# Altium footprint library Tomra_Cadstar_Footprints.PcbLib: 373 footprints (part 20 of 24)
Each footprint in its own frame and in the unit in brackets; x right, y up, seen from the top. Pads: shape width x height; smd on the part's side, far side on the other; paste and mask are expansions set on the pad; w line width, h text height; cw(c..) or ccw(c..) is an arc to the next point about the centre after c.
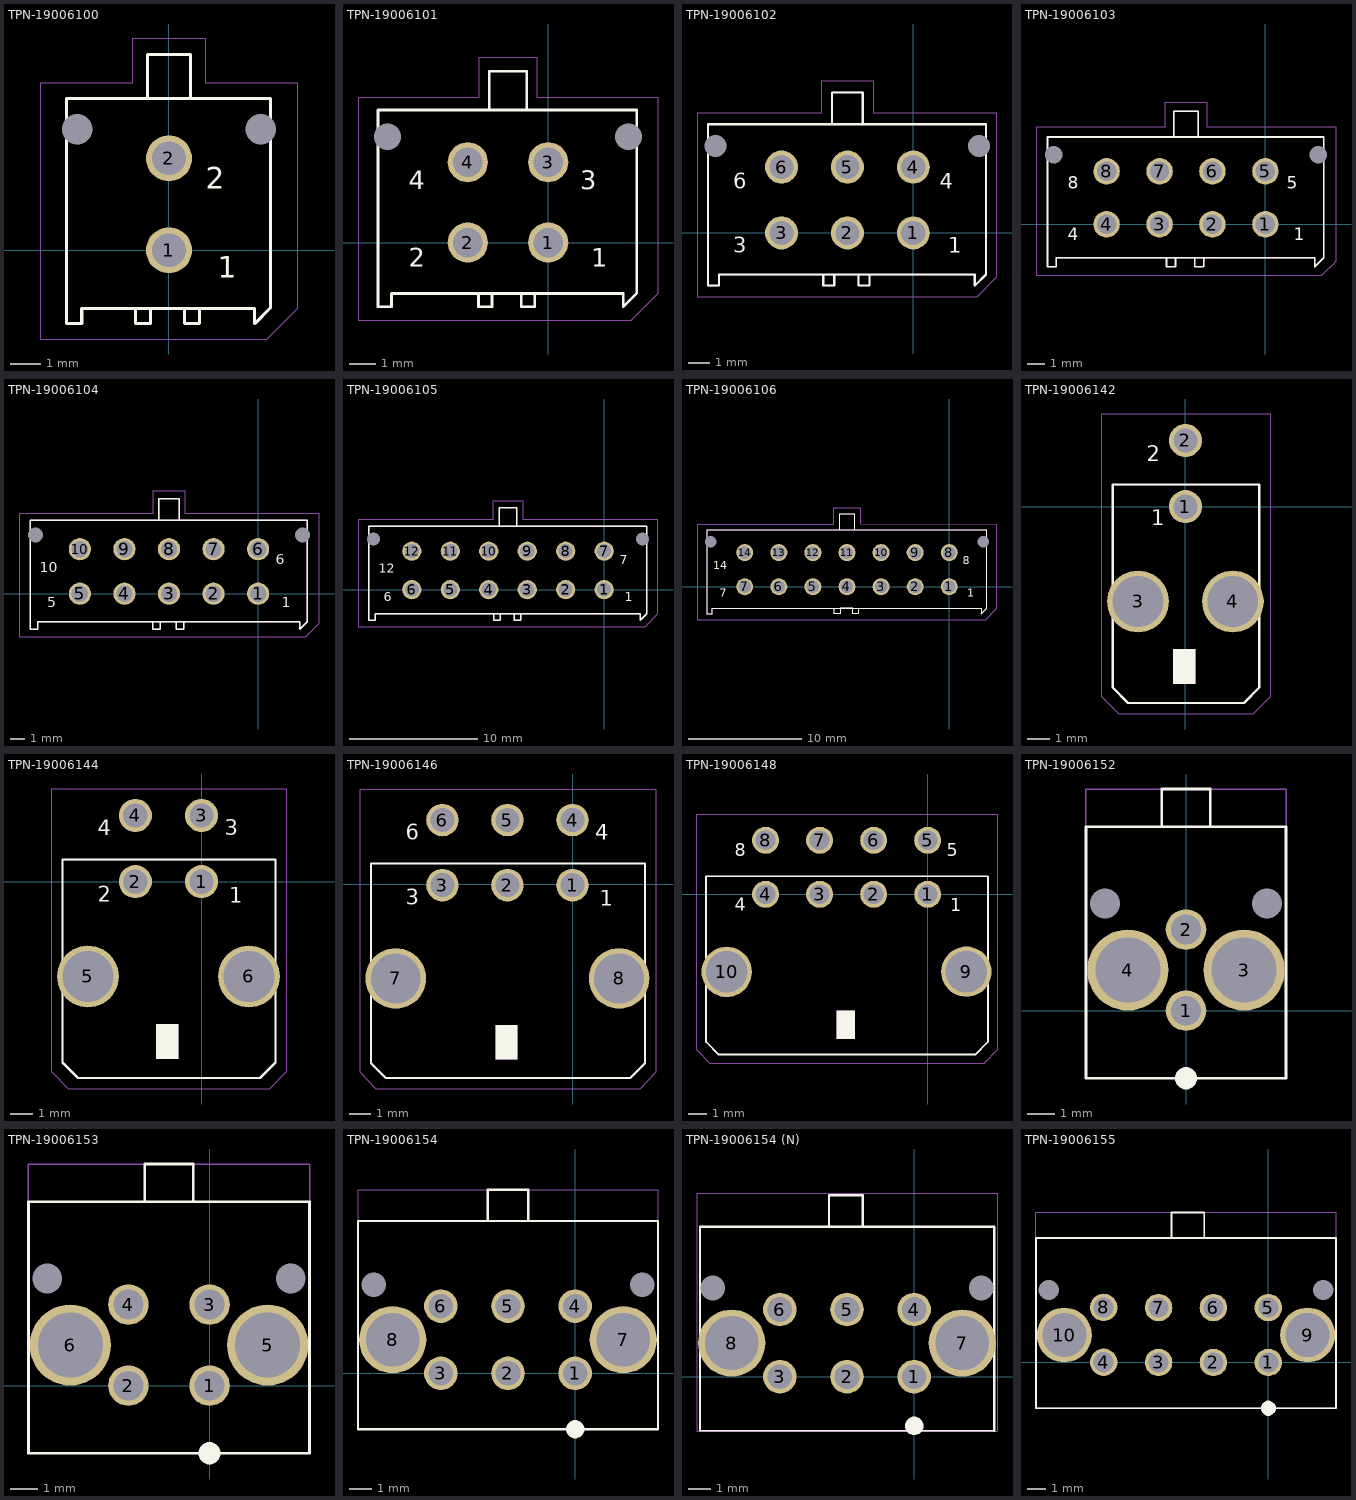
[diagram p19: the footprints below, top view; thin cyan lines are the x and y axes]

## TPN-19006100 [mm]
pads (4):
  round 1.5 / inner round 1.524 / far side round 1.5 hole 1.1 paste+0 mask+0: 1(0,0) 2(0,3)
  round 0 / inner round 1.524 / far side round 0 hole 1 unplated paste+0 mask+0: 3(3,3.95) 4(-3,3.95)
Top Silk:
  lines w0.1: -1.1,-1.9 -1.1,-2.4 -0.6,-2.4 -0.6,-1.9 0.5,-1.9 0.5,-2.4 1,-2.4 1,-1.9 ; -0.7,5 -0.7,6.4 0.7,6.4 0.7,5 ; -3.35,-2.4 -2.85,-2.4 -2.85,-1.9 2.8,-1.9 2.8,-2.4 3.31,-1.89 3.31,4.95 -3.35,4.95 -3.35,-2.4
  text "1" at 1.6,-0.9 h0.7
  text "2" at 1.2,2 h0.7
  text ".Designator" at 0,0 h0.7
Top Assembly:
  lines w0.05: -1.1,-1.9 -1.1,-2.4 -0.6,-2.4 -0.6,-1.9 0.5,-1.9 0.5,-2.4 1,-2.4 1,-1.9 ; -0.7,5 -0.7,6.4 0.7,6.4 0.7,5 ; -3.35,-2.4 -2.85,-2.4 -2.85,-1.9 2.8,-1.9 2.8,-2.4 3.31,-1.89 3.31,4.95 -3.35,4.95 -3.35,-2.4
Top Placement:
  lines w0.01: -4.2,-2.9 -4.2,5.45 -1.2,5.45 -1.2,6.9 1.2,6.9 1.2,5.45 4.2,5.45 4.2,-1.9 3.2,-2.9 -4.2,-2.9

## TPN-19006101 [mm]
height 9.8
pads (6):
  round 1.5 / inner round 1.524 / far side round 1.5 hole 1.1 paste+0 mask+0: 1(0,0) 2(-3,0) 3(0,3) 4(-3,3)
  round 0 / inner round 1.524 / far side round 0 hole 1 unplated paste+0 mask+0: 5(-6,3.95) 6(3,3.95)
Top Silk:
  lines w0.1: -2.6,-1.9 -2.6,-2.4 -2.1,-2.4 -2.1,-1.9 -1,-1.9 -1,-2.4 -0.5,-2.4 -0.5,-1.9 ; -2.2,5 -2.2,6.4 -0.8,6.4 -0.8,5 ; -6.35,-2.4 -5.85,-2.4 -5.85,-1.9 2.8,-1.9 2.8,-2.4 3.31,-1.89 3.31,4.95 -6.35,4.95 -6.35,-2.4
  text "1" at 1.6,-0.9 h0.7
  text "3" at 1.2,2 h0.7
  text "4" at -5.2,2 h0.7
  text "2" at -5.2,-0.9 h0.7
  text ".Designator" at 0,0 h0.7
Top Assembly:
  lines w0.05: -2.6,-1.9 -2.6,-2.4 -2.1,-2.4 -2.1,-1.9 -1,-1.9 -1,-2.4 -0.5,-2.4 -0.5,-1.9 ; -2.2,5 -2.2,6.4 -0.8,6.4 -0.8,5 ; -6.35,-2.4 -5.85,-2.4 -5.85,-1.9 2.8,-1.9 2.8,-2.4 3.31,-1.89 3.31,4.95 -6.35,4.95 -6.35,-2.4
  text "1" at 1.6,-0.9 h0.7
  text "3" at 1.2,2 h0.7
  text "4" at -5.2,2 h0.7
  text "2" at -5.2,-0.9 h0.7
Top Placement:
  lines w0.01: -7.1,-2.9 3.1,-2.9 4.1,-1.9 4.1,5.4 -0.4,5.4 -0.4,6.9 -2.6,6.9 -2.6,5.4 -7.1,5.4 -7.1,-2.9

## TPN-19006102 [mm]
pads (8):
  round 1.5 / inner round 1.524 / far side round 1.5 hole 1.1 paste+0 mask+0: 1(0,0) 2(-3,0) 3(-6,0) 4(0,3) 5(-3,3) 6(-6,3)
  round 0 / inner round 1.524 / far side round 0 hole 1 unplated paste+0 mask+0: 7(3,3.95) 8(-9,3.95)
Top Silk:
  lines w0.1: -4.1,-1.9 -4.1,-2.4 -3.6,-2.4 -3.6,-1.9 -2.5,-1.9 -2.5,-2.4 -2,-2.4 -2,-1.9 ; -3.7,5 -3.7,6.4 -2.3,6.4 -2.3,5 ; -9.35,-2.4 -8.85,-2.4 -8.85,-1.9 2.8,-1.9 2.8,-2.4 3.31,-1.89 3.31,4.95 -9.35,4.95 -9.35,-2.4
  text "1" at 1.6,-0.9 h0.7
  text "4" at 1.2,2 h0.7
  text "6" at -8.2,2 h0.7
  text "3" at -8.2,-0.9 h0.7
  text ".Designator" at 0,0 h0.7
Top Assembly:
  lines w0.05: -4.1,-1.9 -4.1,-2.4 -3.6,-2.4 -3.6,-1.9 -2.5,-1.9 -2.5,-2.4 -2,-2.4 -2,-1.9 ; -3.7,5 -3.7,6.4 -2.3,6.4 -2.3,5 ; -9.35,-2.4 -8.85,-2.4 -8.85,-1.9 2.8,-1.9 2.8,-2.4 3.31,-1.89 3.31,4.95 -9.35,4.95 -9.35,-2.4
Top Placement:
  lines w0.01: -9.85,-2.9 -9.85,5.45 -4.2,5.45 -4.2,6.9 -1.8,6.9 -1.8,5.45 3.81,5.45 3.81,-1.99 2.9,-2.9 -9.85,-2.9

## TPN-19006103 [mm]
height 9.8
pads (10):
  round 1.5 / inner round 1.524 / far side round 1.5 hole 1.1 paste+0 mask+0: 1(0,0) 2(-3,0) 3(-6,0) 4(-9,0) 5(0,3) 6(-3,3) 7(-6,3) 8(-9,3)
  round 0 / inner round 1.524 / far side round 0 hole 1 unplated paste+0 mask+0: 9(3,3.95) 10(-12,3.95)
Top Silk:
  lines w0.1: -5.6,-1.9 -5.6,-2.4 -5.1,-2.4 -5.1,-1.9 -4,-1.9 -4,-2.4 -3.5,-2.4 -3.5,-1.9 ; -5.2,5 -5.2,6.4 -3.8,6.4 -3.8,5 ; -12.35,-2.4 -11.85,-2.4 -11.85,-1.9 2.8,-1.9 2.8,-2.4 3.31,-1.89 3.31,4.95 -12.35,4.95 -12.35,-2.4
  text "1" at 1.6,-0.9 h0.7
  text "5" at 1.2,2 h0.7
  text "8" at -11.2,2 h0.7
  text "4" at -11.2,-0.9 h0.7
  text ".Designator" at 0,0 h0.7
Top Assembly:
  lines w0.05: -5.6,-1.9 -5.6,-2.4 -5.1,-2.4 -5.1,-1.9 -4,-1.9 -4,-2.4 -3.5,-2.4 -3.5,-1.9 ; -5.2,5 -5.2,6.4 -3.8,6.4 -3.8,5 ; -12.35,-2.4 -11.85,-2.4 -11.85,-1.9 2.8,-1.9 2.8,-2.4 3.31,-1.89 3.31,4.95 -12.35,4.95 -12.35,-2.4
Top Placement:
  lines w0.01: -13,-2.9 3.2,-2.9 4,-2.1 4,5.5 -3.3,5.5 -3.3,6.9 -5.7,6.9 -5.7,5.5 -13,5.5 -13,-2.9

## TPN-19006104 [mm]
height 10
pads (12):
  round 1.5 / inner round 1.524 / far side round 1.5 hole 1.1 paste+0 mask+0: 1(0,0) 2(-3,0) 3(-6,0) 4(-9,0) 5(-12,0) 6(0,3) 7(-3,3) 8(-6,3) 9(-9,3) 10(-12,3)
  round 0 / inner round 1.524 / far side round 0 hole 1 unplated paste+0 mask+0: 11(3,3.95) 12(-15,3.95)
Top Silk:
  lines w0.1: -7.1,-1.9 -7.1,-2.4 -6.6,-2.4 -6.6,-1.9 -5.5,-1.9 -5.5,-2.4 -5,-2.4 -5,-1.9 ; -6.7,5 -6.7,6.4 -5.3,6.4 -5.3,5 ; -15.35,-2.4 -14.85,-2.4 -14.85,-1.9 2.8,-1.9 2.8,-2.4 3.31,-1.89 3.31,4.95 -15.35,4.95 -15.35,-2.4
  text "1" at 1.6,-0.9 h0.7
  text "6" at 1.2,2 h0.7
  text "5" at -14.2,-0.9 h0.7
  text "10" at -14.7,1.45 h0.7
  text ".Designator" at 0,0 h0.7
Top Assembly:
  lines w0.05: -7.1,-1.9 -7.1,-2.4 -6.6,-2.4 -6.6,-1.9 -5.5,-1.9 -5.5,-2.4 -5,-2.4 -5,-1.9 ; -6.7,5 -6.7,6.4 -5.3,6.4 -5.3,5 ; -15.35,-2.4 -14.85,-2.4 -14.85,-1.9 2.8,-1.9 2.8,-2.4 3.31,-1.89 3.31,4.95 -15.35,4.95 -15.35,-2.4
Top Placement:
  lines w0.01: -16.1,-2.9 3.2,-2.9 4.1,-2 4.1,5.4 -4.9,5.4 -4.9,6.9 -7.1,6.9 -7.1,5.4 -16.1,5.4 -16.1,-2.9

## TPN-19006105 [mm]
pads (14):
  round 1.5 / inner round 1.524 / far side round 1.5 hole 1.1 paste+0 mask+0: 1(0,0) 2(-3,0) 3(-6,0) 4(-9,0) 5(-12,0) 6(-15,0) 7(0,3) 8(-3,3) 9(-6,3) 10(-9,3) 11(-12,3) 12(-15,3)
  round 0 / inner round 1.524 / far side round 0 hole 1 unplated paste+0 mask+0: 13(3,3.95) 14(-18,3.95)
Top Silk:
  lines w0.1: -8.6,-1.9 -8.6,-2.4 -8.1,-2.4 -8.1,-1.9 -7,-1.9 -7,-2.4 -6.5,-2.4 -6.5,-1.9 ; -8.2,5 -8.2,6.4 -6.8,6.4 -6.8,5 ; -18.35,-2.4 -17.85,-2.4 -17.85,-1.9 2.8,-1.9 2.8,-2.4 3.31,-1.89 3.31,4.95 -18.35,4.95 -18.35,-2.4
  text "1" at 1.6,-0.9 h0.7
  text "7" at 1.2,2 h0.7
  text "6" at -17.2,-0.9 h0.7
  text "12" at -17.6,1.3 h0.7
  text ".Designator" at 0,0 h0.7
Top Assembly:
  lines w0.05: -8.6,-1.9 -8.6,-2.4 -8.1,-2.4 -8.1,-1.9 -7,-1.9 -7,-2.4 -6.5,-2.4 -6.5,-1.9 ; -8.2,5 -8.2,6.4 -6.8,6.4 -6.8,5 ; -18.35,-2.4 -17.85,-2.4 -17.85,-1.9 2.8,-1.9 2.8,-2.4 3.31,-1.89 3.31,4.95 -18.35,4.95 -18.35,-2.4
Top Placement:
  lines w0.01: -19.2,-2.9 -19.2,5.45 -8.7,5.45 -8.7,6.9 -6.3,6.9 -6.3,5.45 4.2,5.45 4.2,-1.9 3.2,-2.9 -19.2,-2.9

## TPN-19006106 [mm]
pads (16):
  round 1.5 / inner round 1.524 / far side round 1.5 hole 1.1 paste+0 mask+0: 1(0,0) 2(-3,0) 3(-6,0) 4(-9,0) 5(-12,0) 6(-15,0) 7(-18,0) 8(0,3) 9(-3,3) 10(-6,3) 11(-9,3) 12(-12,3) 13(-15,3) 14(-18,3)
  round 0 / inner round 1.524 / far side round 0 hole 1 unplated paste+0 mask+0: 15(3,3.95) 16(-21,3.95)
Top Silk:
  lines w0.1: -10.1,-1.9 -10.1,-2.4 -9.6,-2.4 -9.6,-1.9 -8.5,-1.9 -8.5,-2.4 -8,-2.4 -8,-1.9 ; -9.7,5 -9.7,6.4 -8.3,6.4 -8.3,5 ; -21.35,-2.4 -20.85,-2.4 -20.85,-1.9 2.8,-1.9 2.8,-2.4 3.31,-1.89 3.31,4.95 -21.35,4.95 -21.35,-2.4
  text "1" at 1.6,-0.9 h0.7
  text "7" at -20.2,-0.9 h0.7
  text "14" at -20.75,1.55 h0.7
  text "8" at 1.2,2 h0.7
  text ".Designator" at 0,0 h0.7
Top Assembly:
  lines w0.05: -10.1,-1.9 -10.1,-2.4 -9.6,-2.4 -9.6,-1.9 -8.5,-1.9 -8.5,-2.4 -8,-2.4 -8,-1.9 ; -9.7,5 -9.7,6.4 -8.3,6.4 -8.3,5 ; -21.35,-2.4 -20.85,-2.4 -20.85,-1.9 2.8,-1.9 2.8,-2.4 3.31,-1.89 3.31,4.95 -21.35,4.95 -21.35,-2.4
Top Placement:
  lines w0.01: -22.2,-2.9 -22.2,5.45 -10.2,5.45 -10.2,6.9 -7.8,6.9 -7.8,5.5 4.2,5.45 4.2,-1.9 3.2,-2.9 -22.2,-2.9

## TPN-19006142 [mm]
pads (4):
  round 1.5 / inner round 1.524 / far side round 1.5 hole 1.1 paste+0 mask+0: 1(0,0) 2(0,3)
  round 2.8 / inner round 1.524 / far side round 2.8 hole 2.3 paste+0 mask+0: 3(-2.15,-4.3) 4(2.15,-4.3)
Top Silk:
  region: -0.55,-6.47 0.45,-6.47 0.45,-8.02 -0.55,-8.02
  lines w0.1: -3.3,-8.2 -2.6,-8.9 2.65,-8.9 3.35,-8.2 3.35,1 -3.3,1 -3.3,-8.2
  text "2" at -1.75,2.05 h0.7
  text "1" at -1.55,-0.85 h0.7
  text ".Designator" at 0,0 h0.7
Top Assembly:
  region: -0.55,-6.47 0.45,-6.47 0.45,-8.02 -0.55,-8.02
  lines w0.05: -3.3,-8.2 -2.6,-8.9 2.65,-8.9 3.35,-8.2 3.35,1 -3.3,1 -3.3,-8.2
  text "2" at -1.75,2.05 h0.7
  text "1" at -1.55,-0.85 h0.7
Top Placement:
  lines w0.01: -3.8,-8.629 -2.995,-9.4 3.045,-9.4 3.85,-8.629 3.85,4.2 -3.8,4.2 -3.8,-8.629

## TPN-19006144 [mm]
height 10
pads (6):
  round 1.5 / inner round 1.524 / far side round 1.5 hole 1.1 paste+0 mask+0: 1(0,0) 2(-3,0) 3(0,3) 4(-3,3)
  round 2.8 / inner round 1.524 / far side round 2.8 hole 2.3 paste+0 mask+0: 5(-5.15,-4.3) 6(2.15,-4.3)
Top Silk:
  region: -2.05,-6.47 -1.05,-6.47 -1.05,-8.02 -2.05,-8.02
  lines w0.1: -6.3,-8.2 -5.6,-8.9 2.65,-8.9 3.35,-8.2 3.35,1 -6.3,1 -6.3,-8.2
  text "1" at 1.25,-0.95 h0.7
  text "2" at -4.7,-0.9 h0.7
  text "3" at 1.05,2.1 h0.7
  text "4" at -4.7,2.1 h0.7
  text ".Designator" at 0,0 h0.7
Top Assembly:
  region: -2.05,-6.47 -1.05,-6.47 -1.05,-8.02 -2.05,-8.02
  lines w0.05: -6.3,-8.2 -5.6,-8.9 2.65,-8.9 3.35,-8.2 3.35,1 -6.3,1 -6.3,-8.2
  text "1" at 1.25,-0.95 h0.7
  text "2" at -4.7,-0.9 h0.7
  text "3" at 1.05,2.1 h0.7
  text "4" at -4.7,2.1 h0.7
Top Placement:
  lines w0.01: -6.8,-8.629 -6.027,-9.4 3.077,-9.4 3.85,-8.629 3.85,4.2 -6.8,4.2 -6.8,-8.629

## TPN-19006146 [mm]
pads (8):
  round 1.5 / inner round 1.524 / far side round 1.5 hole 1.1 paste+0 mask+0: 1(-0.02,-0.04) 2(-3.02,-0.04) 3(-6.02,-0.04) 4(-0.02,2.96) 5(-3.02,2.96) 6(-6.02,2.96)
  round 2.8 / inner round 1.524 / far side round 2.8 hole 2.3 paste+0 mask+0: 7(-8.17,-4.34) 8(2.13,-4.34)
Top Silk:
  region: -3.57,-6.51 -2.57,-6.51 -2.57,-8.06 -3.57,-8.06
  lines w0.1: -9.32,-8.24 -8.62,-8.94 2.63,-8.94 3.33,-8.24 3.33,0.96 -9.32,0.96 -9.32,-8.24
  text "4" at 1.03,2.06 h0.7
  text "1" at 1.23,-0.99 h0.7
  text "6" at -7.72,2.06 h0.7
  text "3" at -7.72,-0.94 h0.7
  text ".Designator" at 0,0 h0.7
Top Assembly:
  region: -3.57,-6.51 -2.57,-6.51 -2.57,-8.06 -3.57,-8.06
  lines w0.05: -9.32,-8.24 -8.62,-8.94 2.63,-8.94 3.33,-8.24 3.33,0.96 -9.32,0.96 -9.32,-8.24
  text "1" at 1.23,-0.99 h0.7
  text "6" at -7.72,2.06 h0.7
  text "3" at -7.72,-0.94 h0.7
  text "4" at 1.03,2.06 h0.7
Top Placement:
  lines w0.01: -9.82,-8.669 -9.065,-9.44 3.075,-9.44 3.83,-8.669 3.83,4.395 -9.82,4.395 -9.82,-8.669

## TPN-19006148 [mm]
height 10
pads (10):
  round 1.5 / inner round 1.524 / far side round 1.5 hole 1.1 paste+0 mask+0: 1(0,0) 2(-3,0) 3(-6,0) 4(-9,0) 5(0,3) 6(-3,3) 7(-6,3) 8(-9,3)
  round 2.8 / inner round 1.524 / far side round 2.8 hole 2.3 paste+0 mask+0: 9(2.15,-4.3) 10(-11.16,-4.31)
Top Silk:
  region: -5.05,-6.47 -4.05,-6.47 -4.05,-8.02 -5.05,-8.02
  lines w0.1: -12.31,-8.2 -11.61,-8.9 2.65,-8.9 3.35,-8.2 3.35,1 -12.31,1 -12.31,-8.2
  text "1" at 1.25,-0.95 h0.7
  text "8" at -10.7,2.1 h0.7
  text "4" at -10.7,-0.9 h0.7
  text "5" at 1.05,2.1 h0.7
  text ".Designator" at 0,0 h0.7
Top Assembly:
  region: -5.05,-6.47 -4.05,-6.47 -4.05,-8.02 -5.05,-8.02
  lines w0.05: -12.31,-8.2 -11.61,-8.9 2.65,-8.9 3.35,-8.2 3.35,1 -12.31,1 -12.31,-8.2
  text "1" at 1.25,-0.95 h0.7
  text "8" at -10.7,2.1 h0.7
  text "4" at -10.7,-0.9 h0.7
  text "5" at 1.05,2.1 h0.7
Top Placement:
  lines w0.01: -12.81,-8.629 -12.065,-9.4 3.105,-9.4 3.85,-8.629 3.85,4.435 -12.81,4.435 -12.81,-8.629

## TPN-19006152 [mm]
height 10
pads (6):
  round 1.5 / inner round 1.524 / far side round 1.5 hole 1.1 paste+0 mask+0: 1(0,0) 2(0,3)
  round 3 / inner round 1.524 / far side round 3 hole 2.4 paste+0 mask+0: 3(2.15,1.5) 4(-2.15,1.5)
  round 0 / inner round 1.524 / far side round 0 hole 1.1 unplated paste+0 mask+0: 5(3,3.96) 6(-3,3.96)
Top Silk:
  region: 0,-2.9 -0.08,-2.9 -0.227,-2.839 -0.339,-2.727 -0.4,-2.58 -0.4,-2.42 -0.339,-2.273 -0.227,-2.161 -0.08,-2.1 0,-2.1 0.08,-2.1 0.227,-2.161 0.339,-2.273 0.4,-2.42 0.4,-2.58 0.339,-2.727 0.227,-2.839 0.08,-2.9
  lines w0.1: -3.7,-2.5 3.7,-2.5 3.7,6.8 -3.7,6.8 -3.7,-2.5 ; -0.9,6.8 0.9,6.8 0.9,8.2 -0.9,8.2 -0.9,6.8
  text ".Designator" at -3.2,7.3 h0.7
Top Assembly:
  lines w0.05: -3.7,-2.5 3.7,-2.5 3.7,8.2 -3.7,8.2 -3.7,-2.5
Top Placement:
  lines w0.01: -3.7,-2.5 3.7,-2.5 3.7,8.2 -3.7,8.2 -3.7,-2.5

## TPN-19006153 [mm]
height 10
pads (8):
  round 1.5 / inner round 1.524 / far side round 1.5 hole 1.1 paste+0 mask+0: 1(0,0) 2(-3,0) 3(0,3) 4(-3,3)
  round 3 / inner round 1.524 / far side round 3 hole 2.4 paste+0 mask+0: 5(2.15,1.5) 6(-5.15,1.5)
  round 0 / inner round 1.524 / far side round 0 hole 1.1 unplated paste+0 mask+0: 7(3,3.96) 8(-6,3.96)
Top Silk:
  region: 0,-2.9 -0.08,-2.9 -0.227,-2.839 -0.339,-2.727 -0.4,-2.58 -0.4,-2.42 -0.339,-2.273 -0.227,-2.161 -0.08,-2.1 0,-2.1 0.08,-2.1 0.227,-2.161 0.339,-2.273 0.4,-2.42 0.4,-2.58 0.339,-2.727 0.227,-2.839 0.08,-2.9
  lines w0.1: -6.7,-2.5 3.7,-2.5 3.7,6.8 -6.7,6.8 -6.7,-2.5 ; -2.4,6.8 -0.6,6.8 -0.6,8.2 -2.4,8.2 -2.4,6.8
  text ".Designator" at -6.2,7.3 h0.7
Top Assembly:
  lines w0.05: -6.7,-2.5 3.7,-2.5 3.7,8.2 -6.7,8.2 -6.7,-2.5
Top Placement:
  lines w0.01: -6.7,-2.5 3.7,-2.5 3.7,8.2 -6.7,8.2 -6.7,-2.5

## TPN-19006154 [mm]
height 10
pads (10):
  round 1.5 / inner round 1.524 / far side round 1.5 hole 1.1 paste+0 mask+0: 1(0,0) 2(-3,0) 3(-6,0) 4(0,3) 5(-3,3) 6(-6,3)
  round 3 / inner round 1.524 / far side round 3 hole 2.4 paste+0 mask+0: 7(2.15,1.5) 8(-8.15,1.5)
  round 0 / inner round 1.524 / far side round 0 hole 1.1 unplated paste+0 mask+0: 9(3,3.96) 10(-9,3.96)
Top Silk:
  region: 0,-2.9 -0.08,-2.9 -0.227,-2.839 -0.339,-2.727 -0.4,-2.58 -0.4,-2.42 -0.339,-2.273 -0.227,-2.161 -0.08,-2.1 0,-2.1 0.08,-2.1 0.227,-2.161 0.339,-2.273 0.4,-2.42 0.4,-2.58 0.339,-2.727 0.227,-2.839 0.08,-2.9
  lines w0.1: -9.7,-2.5 3.7,-2.5 3.7,6.8 -9.7,6.8 -9.7,-2.5 ; -3.9,6.8 -3.9,8.2 -2.1,8.2 -2.1,6.8 -3.9,6.8
  text ".Designator" at -9.2,7.2 h0.7
Top Assembly:
  lines w0.05: -9.7,-2.5 3.7,-2.5 3.7,6.8 -2.1,6.8 -2.1,8.2 -3.9,8.2 -3.9,6.8 -9.7,6.8 -9.7,-2.5
Top Placement:
  lines w0.01: -9.7,-2.5 3.7,-2.5 3.7,8.2 -9.7,8.2 -9.7,-2.5

## TPN-19006154 (N) [mm]
height 10
pads (10):
  round 1.5 / inner round 1.524 / far side round 1.5 hole 1.1 paste+0 mask+0: 1(0,0) 2(-3,0) 3(-6,0) 4(0,3) 5(-3,3) 6(-6,3)
  round 3 / inner round 1.524 / far side round 3 hole 2.4 paste+0 mask+0: 7(2.15,1.5) 8(-8.15,1.5)
  round 0 / inner round 1.524 / far side round 0 hole 1.1 unplated paste+0 mask+0: 9(3,3.96) 10(-9,3.96)
Top Silk:
  region: 0,-2.6 -0.08,-2.6 -0.227,-2.539 -0.339,-2.427 -0.4,-2.28 -0.4,-2.12 -0.339,-1.973 -0.227,-1.861 -0.08,-1.8 0,-1.8 0.08,-1.8 0.227,-1.861 0.339,-1.973 0.4,-2.12 0.4,-2.28 0.339,-2.427 0.227,-2.539 0.08,-2.6
  lines w0.1: -9.57,-2.4 3.58,-2.43 3.58,6.7 -9.57,6.7 -9.57,-2.4 ; -3.8,6.7 -3.8,8.1 -2.3,8.1 -2.3,6.7 -3.8,6.7
  text ".Designator" at -9.7,8.2 h0.7
Top Assembly:
  lines w0.05: -9.57,-2.43 3.53,-2.43 3.53,6.7 -2.3,6.7 -2.3,8.1 -3.8,8.1 -3.8,6.7 -9.57,6.7 -9.57,-2.43
Top Placement:
  lines w0.01: -9.7,-2.46 3.7,-2.46 3.7,8.2 -9.7,8.2 -9.7,-2.46

## TPN-19006155 [mm]
height 10
pads (12):
  round 1.5 / inner round 1.524 / far side round 1.5 hole 1.1 paste+0 mask+0: 1(0,0) 2(-3,0) 3(-6,0) 4(-9,0.01) 5(0,3) 6(-3,3) 7(-6,3) 8(-9,3.01)
  round 3 / inner round 1.524 / far side round 3 hole 2.4 paste+0 mask+0: 9(2.15,1.5) 10(-11.15,1.5)
  round 0 / inner round 1.524 / far side round 0 hole 1.1 unplated paste+0 mask+0: 11(3,3.96) 12(-12,3.96)
Top Silk:
  region: 0,-2.9 -0.08,-2.9 -0.227,-2.839 -0.339,-2.727 -0.4,-2.58 -0.4,-2.42 -0.339,-2.273 -0.227,-2.161 -0.08,-2.1 0,-2.1 0.08,-2.1 0.227,-2.161 0.339,-2.273 0.4,-2.42 0.4,-2.58 0.339,-2.727 0.227,-2.839 0.08,-2.9
  lines w0.1: -12.7,-2.5 3.7,-2.5 3.7,6.8 -12.7,6.8 -12.7,-2.5 ; -5.3,6.8 -3.5,6.8 -3.5,8.2 -5.3,8.2 -5.3,6.8
  text ".Designator" at -12.2,7.3 h0.7
Top Assembly:
  lines w0.05: -12.7,-2.5 3.7,-2.5 3.7,8.2 -12.7,8.2 -12.7,-2.5
Top Placement:
  lines w0.01: -12.7,-2.5 3.7,-2.5 3.7,8.2 -12.7,8.2 -12.7,-2.5